# Altium footprint library pcb2D3D库101.PcbLib: 411 footprints (part 5 of 26)
Each footprint in its own frame and in the unit in brackets; x right, y up, seen from the top. Pads: shape width x height; smd on the part's side, far side on the other; paste and mask are expansions set on the pad; w line width, h text height; cw(c..) or ccw(c..) is an arc to the next point about the centre after c.
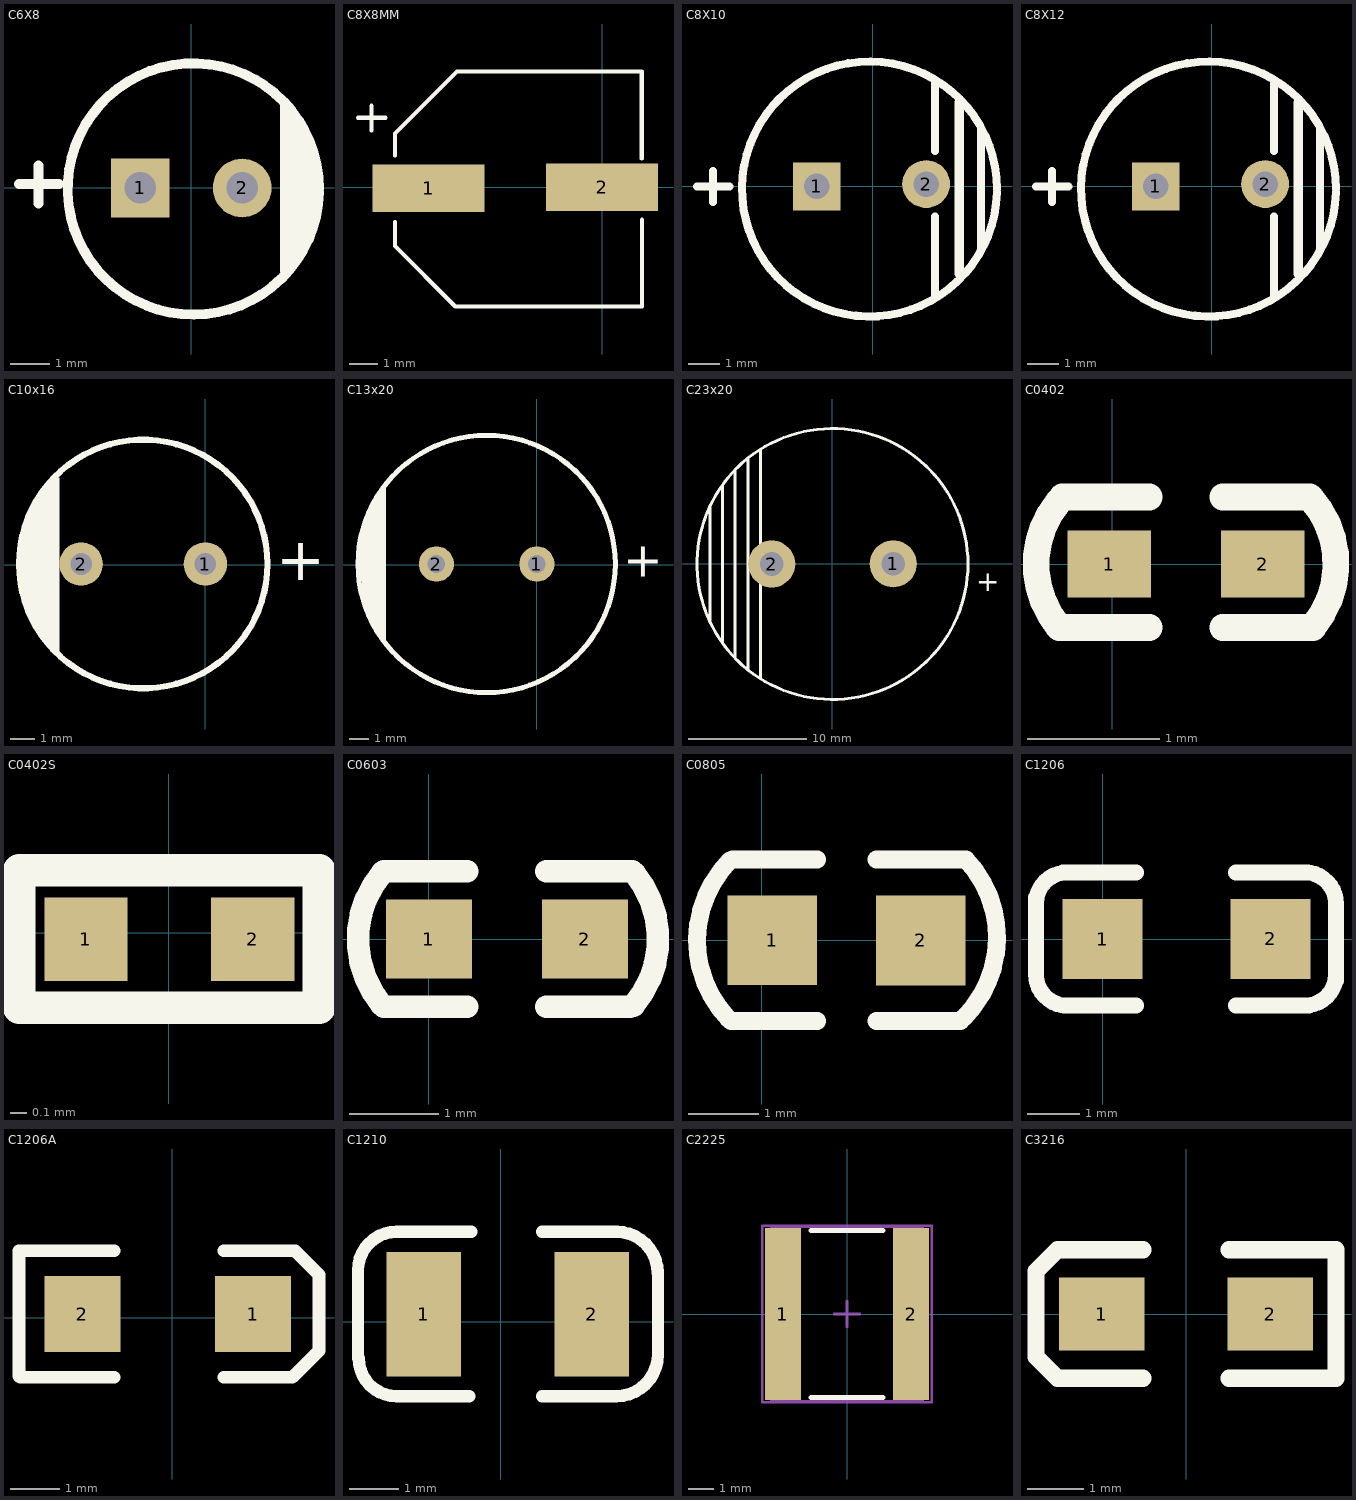
[diagram p4: the footprints below, top view; thin cyan lines are the x and y axes]

## C6X8 [mm]
pads (2):
  rect 1.5x1.5 hole 0.8: 1(-1.3,0)
  round 1.5 hole 0.8: 2(1.3,0)
TopOverlay:
  lines w0.254: -4.4,0.1 -3.384,0.1 ; -3.9,-0.4 -3.9,0.567 ; 2.388,-2.108 2.388,2.159 ; 3.261,-0.116 cw(c0.052,-0.028) 3.262,-0.025
  lines w0.3: 2.642,-1.88 2.642,1.778
  lines w0.5: 2.896,-1.245 2.896,1.168
3D body "6_3x7x2_5mm.STEP": height 7.53, standoff -3.01, extent -3.15,-3.201 3.201,3.15

## C8X8MM [mm]
pads (2):
  rect 4x1.7 smd: 1(-6.202,-0.042) 2(0,0)
TopOverlay:
  lines w0.15: -8.726,2.487 -7.742,2.487 ; -8.244,2.027 -8.244,2.916 ; -7.408,-1.238 -7.408,-2.106 -5.249,-4.265 1.429,-4.265 1.429,-1.164 ; -7.398,1.138 -7.398,1.926 -5.186,4.138 1.418,4.138 1.418,1.027
3D body "SL-H.STEP": height 10.5, standoff 0, extent -7.601,-4.197 1.399,4.103

## C8X10 [mm]
pads (2):
  rect 1.5x1.5 hole 0.8: 1(-1.753,-0.013)
  round 1.5 hole 0.8: 2(1.676,0.064)
TopOverlay:
  lines w0.254: -5.512,-0.013 -4.496,-0.013 ; -5.004,-0.495 -5.004,0.472 ; 1.956,-3.467 1.956,-0.953 ; 1.956,1.105 1.956,3.238 ; 3.404,-1.994 3.404,1.816 ; 3.898,-0.201 cw(c-0.1,-0.091) 3.9,-0.088
  lines w0.3: 2.718,-2.756 2.718,2.629
3D body "CAP 8X11_5.STEP": height 11.74, standoff -18.75, extent -4.102,-4 3.898,4

## C8X12 [mm]
pads (2):
  rect 1.5x1.5 hole 0.8: 1(-1.753,-0.013)
  round 1.5 hole 0.8: 2(1.676,0.064)
TopOverlay:
  lines w0.254: -5.512,-0.013 -4.496,-0.013 ; -5.004,-0.495 -5.004,0.472 ; 1.956,-3.467 1.956,-0.953 ; 1.956,1.105 1.956,3.238 ; 3.404,-1.994 3.404,1.816 ; 3.898,-0.201 cw(c-0.1,-0.091) 3.9,-0.088
  lines w0.3: 2.718,-2.756 2.718,2.629
3D body "CAP 8X11_5.STEP": height 11.74, standoff -18.75, extent -4.102,-4 3.898,4

## C10x16 [mil] "RB.2/.4"
pads (2):
  round 70 hole 35: 1(0,1) 2(-200,1)
TopOverlay:
  circle w10: c-100,1 r200
  rectangle: -295,-60 -265,55
  rectangle: -285,-80 -260,90
  rectangle: -270,-110 -245,115
  rectangle: -250,-140 -235,140
  lines w11.81: -245,130 ccw(c-105.35,2.7) -241.45,-128.39
  text "+" at 114,-25 h68.9
3D body "Cap 10x16.STEP": height 708.66, standoff -669.29, extent -296.85,-197.7 96.85,196

## C13x20 [mil] "RB.2/.5"
pads (2):
  round 70 hole 35: 1(0,1) 2(-200,1)
TopOverlay:
  circle w10: c-100,1 r255.91
  rectangle: -312,-149 -300,152
  rectangle: -323,-132 -309,135
  rectangle: -332,-114 -314,121
  lines w10: -349,-29 -349,45 ; -343,-68 -343,72 ; -336,-97 -336,96
  text "+" at 172,-24 h68.9
3D body "Cap 12.5x20.STEP": height 786.92, standoff -748.03, extent -348.13,-245.13 144,247

## C23x20 [mm] "RB.2/.5"
pads (2):
  round 4 hole 2: 1(5.156,0) 2(-5.156,-0.013)
TopOverlay:
  circle w0.254: c0,-0.013 r11.5
  lines w0.254: -10.389,-4.928 -10.389,4.928 ; -9.322,-6.756 -9.322,6.706 ; -8.255,-7.95 -8.255,8.001 ; -7.188,-8.992 -7.188,8.865 ; -6.096,-9.754 -6.096,9.728
  text "+" at 12.217,-2.311 h1.75
3D body "C22X25.step": height 25, standoff 0, extent -10.899,-11.026 11.101,10.975

## C0402 [mil]
pads (2):
  rect 25x20 smd: 1(-1,0) 2(45,0)
TopOverlay:
  lines w8: -15.94,-19 11,-19 ; -15.94,-18.95 cw(c6.42,-0.05) -15.95,18.84 ; -15,20 11,20 ; 33,-19 59.95,-19 ; 33,20 59,20 cw(c37.58,0.05) 59.95,-18.84
3D body "cap_0402.STEP": height 19.68, standoff 0, extent 2.31,-10 41.69,9.69

## C0402S [mil] "1/16W"
pads (2):
  rect 20x20 smd: 1(-19.93,-1.58) 2(20.07,-1.58)
TopOverlay:
  lines w7.87: -36,-18 -36,15 36,15 36,-18 -36,-18
3D body "cap_0402.STEP": height 19.68, standoff 0, extent -19.68,-11.42 19.69,8.26

## C0603 [mil]
pads (2):
  rect 38x35 smd: 1(0,0) 2(69,0)
TopOverlay:
  lines w10: -21,-29 cw(c14.45,-0.04) -20.48,29.56 ; -20,-30 17,-30 ; -20,30 17,30 ; 52,-30 89,-30 ; 52,30 90,30 ; 90.48,-29.56 ccw(c55.55,0.04) 91,29
3D body "User Library-0603 SMD Capacitor.STEP": height 11.89, standoff 0, extent 3.8,-15.8 66.8,15.7

## C0805 [mil]
pads (2):
  rect 50x50 smd: 1(6,0) 2(88.7,-0.1)
TopOverlay:
  lines w10: -18.66,-43.67 cw(c27.24,-0.08) -17.7,44.5 ; -17.2,-45 31,-45 ; -16.3,45 31,45 ; 64,-45 111,-45 ; 64,45 113.1,45 ; 112.92,-43.04 ccw(c67.98,1.54) 114,45
3D body "User Library-0805 SMD Capacitor.STEP": height 30.39, standoff -0.39, extent 7.93,-24.5 86.67,24.71

## C1206 [mil] "3216/A型"
pads (2):
  rect 60x60 smd: 1(0,0) 2(126,0)
TopOverlay:
  lines w11.81: -50,-26 ccw(c-26.5,-26.5) -27,-50 ; -50,27 cw(c-26.5,26.5) -26,50 ; 151,-50 ccw(c151.5,-26.5) 175,-27 ; 152,50 cw(c151.5,26.5) 175,26
  lines w12: -50,-27 -50,31 ; -29,-50 25,-50 ; -28,50 25,50 ; 100,-50 153,-50 ; 100,50 154,50 ; 175,-31 175,27
3D body "Capacitor 1206 SMD1.step": height 39.45, standoff 0, extent 0.01,-31.49 126,31.5

## C1206A [mil] "3216/A型"
pads (2):
  rect 60x60 smd: 1(64,3) 2(-71,3)
TopOverlay:
  lines w10: -121,53 -121,-46 -120,-47 -46,-47 ; -120,53 -46,53 ; 41,-47 94,-47 ; 41,53 95,53 ; 94,53 97,53 116,34 116,-26 95,-47
3D body "Capacitor 1206 SMD1.step": height 39.45, standoff 0, extent -66.99,-28.49 58.99,34.5

## C1210 [mil]
pads (2):
  rect 60x100 smd: 1(-62,6) 2(73,6)
TopOverlay:
  lines w10: -114.8,-29.36 -114.8,41.08 cw(c-83.75,41.08) -83.75,72.13 ; -114.27,-29.36 ccw(c-83.63,-29.36) -83.63,-60 -25.3,-60 ; -83.75,72 -24,72 ; 33,-60 92.52,-60 ccw(c92.52,-26.32) 126.2,-26.32 126.2,39.82 ; 33,72 93.32,72 ; 93,72 cw(c93,39.12) 125.88,39.12
3D body "1210(3225M) Cap.STEP": height 67.1, standoff 0, extent -72.75,-44 84.75,54

## C2225 [mm] "Chip Capacitor, Body 5.7x6.4mm, IPC High Density"
height 1.4
pads (2):
  rect 1.4x6.7 smd: 1(-2.5,0) 2(2.5,0)
TopOverlay:
  lines w0.2: -1.4,-3.25 1.4,-3.25 ; -1.4,3.25 1.4,3.25
Mechanical13:
  lines w0.1: -2.95,-3.4 2.95,-3.4 2.95,3.4 -2.95,3.4 -2.95,-3.4
Mechanical15:
  lines w0.1: -0.5,0 0.5,0 ; 0,-0.5 0,0.5 ; -3.3,-3.45 3.3,-3.45 3.3,3.45 -3.3,3.45 -3.3,-3.45
3D body "User Library-SMD CAPACITOR.STEP": height 1, standoff 0, extent -2.8,-3.023 2.8,3.277

## C3216 [mil] "A型/1206"
pads (2):
  rect 60x51.18 smd: 1(-59,0) 2(59,0)
TopOverlay:
  lines w12: -30,-45 -90,-45 -105,-30 -105,30 -90,45 -30,45 ; 30,-45 105,-45 105,45 30,45
3D body "TAJ-A.STEP": height 62.99, standoff 0, extent -63,-31 62.99,31.99